# Altium footprint library ACTION_排针排座.PcbLib: 121 footprints (part 5 of 8)
Each footprint in its own frame and in the unit in brackets; x right, y up, seen from the top. Pads: shape width x height; smd on the part's side, far side on the other; paste and mask are expansions set on the pad; w line width, h text height; cw(c..) or ccw(c..) is an arc to the next point about the centre after c.
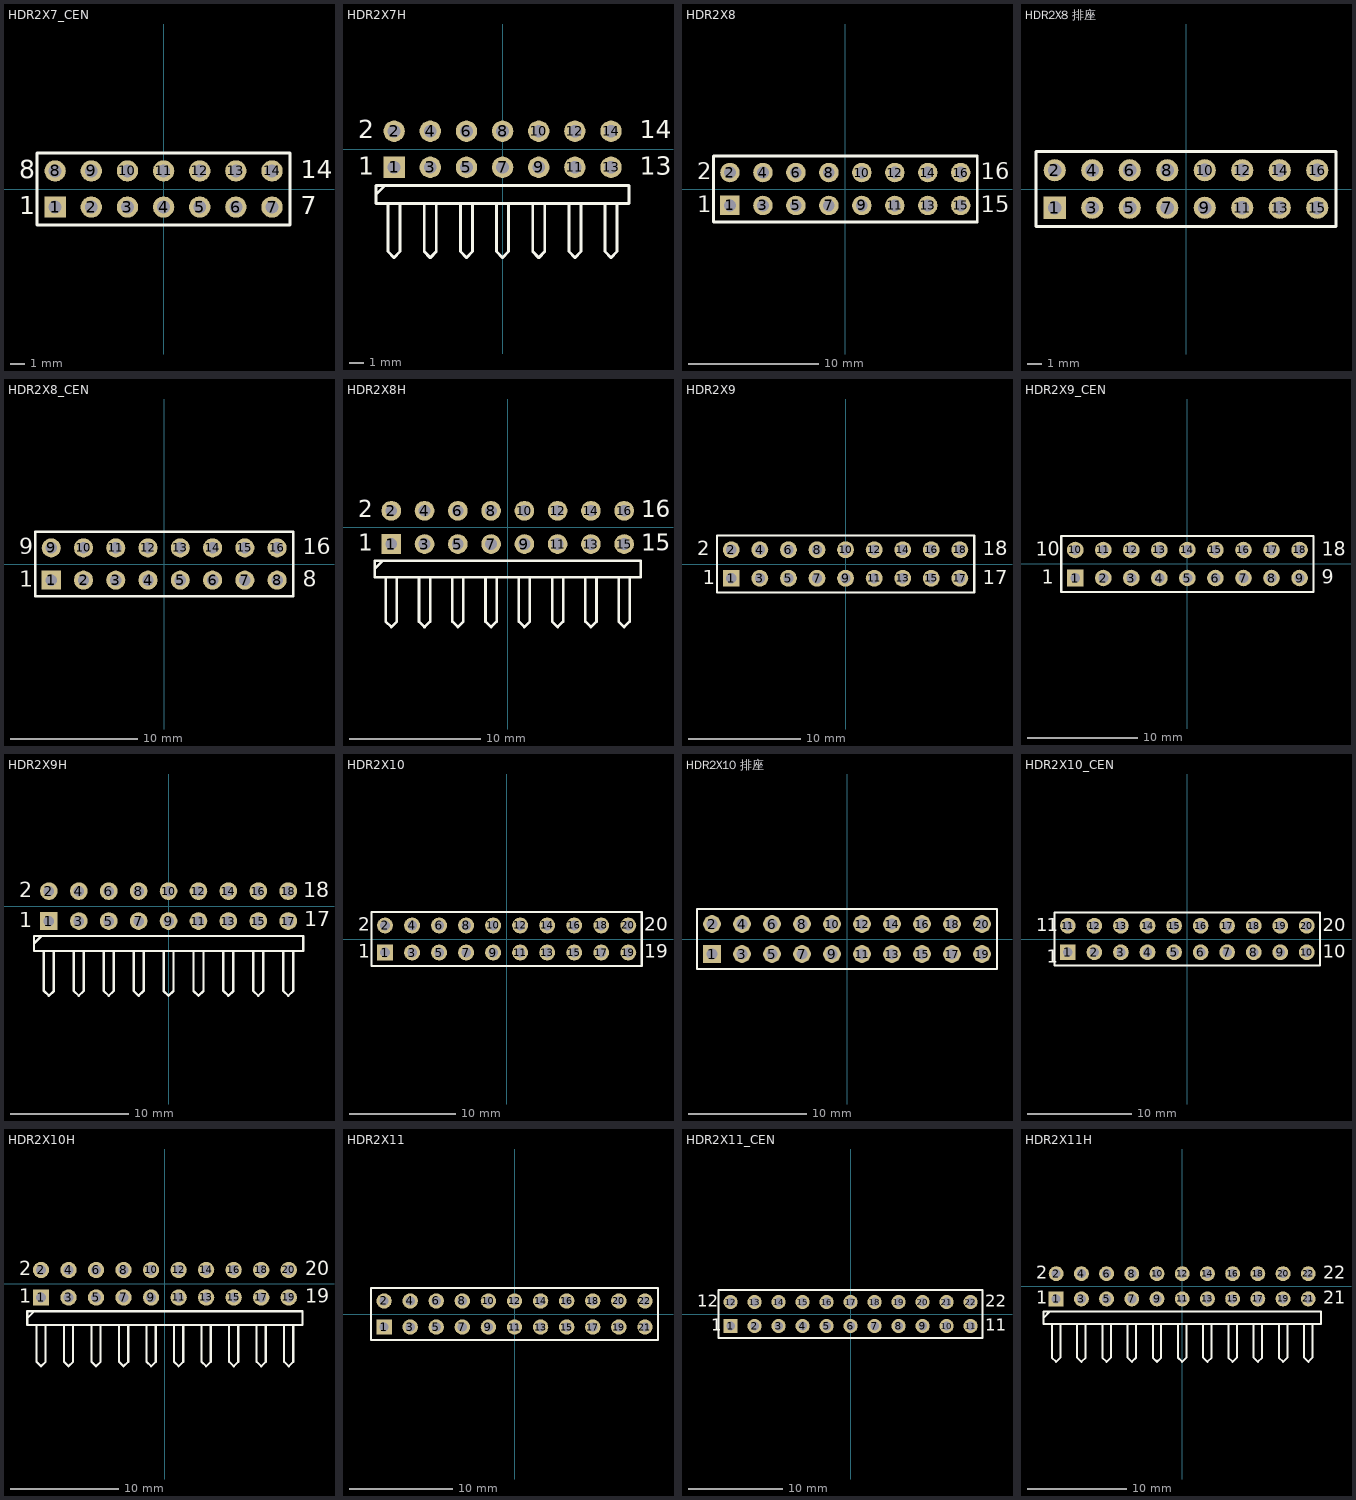
[diagram p4: the footprints below, top view; thin cyan lines are the x and y axes]

## HDR2X7_CEN [mm] "Connector; Header; 7x2 Position"
pads (14):
  rect 1.5x1.5 hole 0.9: 1(-7.62,-1.27)
  round 1.5 hole 0.9: 2(-5.08,-1.27) 3(-2.54,-1.27) 4(0,-1.27) 5(2.54,-1.27) 6(5.08,-1.27) 7(7.62,-1.27) 8(-7.62,1.27) 9(-5.08,1.27) 10(-2.54,1.27) 11(0,1.27) 12(2.54,1.27) 13(5.08,1.27) 14(7.62,1.27)
Top Overlay:
  lines w0.2: -8.89,-2.54 8.89,-2.54 8.89,2.54 -8.89,2.54 -8.89,-2.54
  text "8" at -10.16,0.762 h1.27
  text "1" at -10.16,-1.778 h1.27
  text "7" at 9.652,-1.778 h1.27
  text "14" at 9.652,0.762 h1.27
3D body "HEADER 7X2.STEP": height 10.1, standoff -1.5, extent -8.915,-2.54 8.865,2.54

## HDR2X7H [mm] "Connector; Header; 7x2 Position; Right Angle"
pads (14):
  rect 1.5x1.5 hole 0.9: 1(-7.62,-1.27)
  round 1.5 hole 0.9: 2(-7.62,1.27) 3(-5.08,-1.27) 4(-5.08,1.27) 5(-2.54,-1.27) 6(-2.54,1.27) 7(0,-1.27) 8(0,1.27) 9(2.54,-1.27) 10(2.54,1.27) 11(5.08,-1.27) 12(5.08,1.27) 13(7.62,-1.27) 14(7.62,1.27)
Top Overlay:
  lines w0.2: -8.89,-3.175 -8.255,-2.54 ; -8.043,-3.81 -8.043,-7.197 -7.62,-7.62 -7.197,-7.197 -7.197,-3.81 ; -5.503,-3.81 -5.503,-7.197 -5.08,-7.62 -4.657,-7.197 -4.657,-3.81 ; -2.963,-3.81 -2.963,-7.197 -2.54,-7.62 -2.117,-7.197 -2.117,-3.81 ; -0.423,-3.81 -0.423,-7.197 0,-7.62 0.423,-7.197 0.423,-3.81 ; 2.117,-3.81 2.117,-7.197 2.54,-7.62 2.963,-7.197 2.963,-3.81 ; 4.657,-3.81 4.657,-7.197 5.08,-7.62 5.503,-7.197 5.503,-3.81 ; 7.197,-3.81 7.197,-7.197 7.62,-7.62 8.043,-7.197 8.043,-3.81 ; -8.89,-3.81 -8.89,-2.54 8.89,-2.54 8.89,-3.81 -8.89,-3.81
  text "2" at -10.16,0.762 h1.27
  text "1" at -10.16,-1.778 h1.27
  text "13" at 9.652,-1.778 h1.27
  text "14" at 9.652,0.762 h1.27
3D body "65806.stp": height 3.74, standoff -4.34, extent -8.89,-11.309 8.89,1.591

## HDR2X8 [mm] "Connector; Header; 8x2 Position"
pads (16):
  rect 1.5x1.5 hole 0.9: 1(-8.89,-1.27)
  round 1.5 hole 0.9: 2(-8.89,1.27) 3(-6.35,-1.27) 4(-6.35,1.27) 5(-3.81,-1.27) 6(-3.81,1.27) 7(-1.27,-1.27) 8(-1.27,1.27) 9(1.27,-1.27) 10(1.27,1.27) 11(3.81,-1.27) 12(3.81,1.27) 13(6.35,-1.27) 14(6.35,1.27) 15(8.89,-1.27) 16(8.89,1.27)
Top Overlay:
  lines w0.2: -10.16,-2.54 -10.16,2.54 10.16,2.54 10.16,-2.54 -10.16,-2.54
  text "2" at -11.43,0.762 h1.27
  text "1" at -11.43,-1.778 h1.27
  text "15" at 10.414,-1.778 h1.27
  text "16" at 10.414,0.762 h1.27
3D body "HEADER 8X2.STEP": height 10.1, standoff -1.5, extent -10.109,-2.54 10.211,2.54

## HDR2X8 排座 [mm] "Connector; Header; 8x2 Position"
pads (16):
  rect 1.5x1.5 hole 0.9: 1(-8.89,-1.27)
  round 1.5 hole 0.9: 2(-8.89,1.27) 3(-6.35,-1.27) 4(-6.35,1.27) 5(-3.81,-1.27) 6(-3.81,1.27) 7(-1.27,-1.27) 8(-1.27,1.27) 9(1.27,-1.27) 10(1.27,1.27) 11(3.81,-1.27) 12(3.81,1.27) 13(6.35,-1.27) 14(6.35,1.27) 15(8.89,-1.27) 16(8.89,1.27)
Top Overlay:
  lines w0.2: -10.16,-2.54 10.16,-2.54 10.16,2.54 -10.16,2.54 -10.16,-2.54
3D body "pcb_connector_803-87-016-65-410101.stp": height 7, standoff -2.8, extent -10.16,-2.54 10.16,2.54

## HDR2X8_CEN [mm] "Connector; Header; 8x2 Position"
pads (16):
  rect 1.5x1.5 hole 0.9: 1(-8.89,-1.27)
  round 1.5 hole 0.9: 2(-6.35,-1.27) 3(-3.81,-1.27) 4(-1.27,-1.27) 5(1.27,-1.27) 6(3.81,-1.27) 7(6.35,-1.27) 8(8.89,-1.27) 9(-8.89,1.27) 10(-6.35,1.27) 11(-3.81,1.27) 12(-1.27,1.27) 13(1.27,1.27) 14(3.81,1.27) 15(6.35,1.27) 16(8.89,1.27)
Top Overlay:
  lines w0.2: -10.16,-2.54 -10.16,2.54 10.16,2.54 10.16,-2.54 -10.16,-2.54
  text "9" at -11.43,0.762 h1.27
  text "1" at -11.43,-1.778 h1.27
  text "8" at 10.922,-1.778 h1.27
  text "16" at 10.922,0.762 h1.27
3D body "HEADER 8X2.STEP": height 10.1, standoff -1.5, extent -10.135,-2.565 10.185,2.515

## HDR2X8H [mm] "Connector; Header; 8x2 Position; Right Angle"
pads (16):
  rect 1.5x1.5 hole 0.9: 1(-8.89,-1.27)
  round 1.5 hole 0.9: 2(-8.89,1.27) 3(-6.35,-1.27) 4(-6.35,1.27) 5(-3.81,-1.27) 6(-3.81,1.27) 7(-1.27,-1.27) 8(-1.27,1.27) 9(1.27,-1.27) 10(1.27,1.27) 11(3.81,-1.27) 12(3.81,1.27) 13(6.35,-1.27) 14(6.35,1.27) 15(8.89,-1.27) 16(8.89,1.27)
Top Overlay:
  lines w0.2: -10.16,-3.175 -9.525,-2.54 ; -9.313,-3.81 -9.313,-7.197 -8.89,-7.62 -8.467,-7.197 -8.467,-3.81 ; -6.773,-3.81 -6.773,-7.197 -6.35,-7.62 -5.927,-7.197 -5.927,-3.81 ; -4.233,-3.81 -4.233,-7.197 -3.81,-7.62 -3.387,-7.197 -3.387,-3.81 ; -1.693,-3.81 -1.693,-7.197 -1.27,-7.62 -0.847,-7.197 -0.847,-3.81 ; 0.847,-3.81 0.847,-7.197 1.27,-7.62 1.693,-7.197 1.693,-3.81 ; 3.387,-3.81 3.387,-7.197 3.81,-7.62 4.233,-7.197 4.233,-3.81 ; 5.927,-3.81 5.927,-7.197 6.35,-7.62 6.773,-7.197 6.773,-3.81 ; 8.467,-3.81 8.467,-7.197 8.89,-7.62 9.313,-7.197 9.313,-3.81 ; -10.16,-3.81 -10.16,-2.54 10.16,-2.54 10.16,-3.81 -10.16,-3.81
  text "2" at -11.43,0.762 h1.27
  text "1" at -11.43,-1.778 h1.27
  text "15" at 10.179,-1.778 h1.27
  text "16" at 10.202,0.762 h1.27
3D body "2×8弯.stp": height 5.8, standoff -2.97, extent -10.211,-11.729 10.109,1.626

## HDR2X9 [mm] "Connector; Header; 9x2 Position"
pads (18):
  rect 1.5x1.5 hole 0.9: 1(-10.16,-1.27)
  round 1.5 hole 0.9: 2(-10.16,1.27) 3(-7.62,-1.27) 4(-7.62,1.27) 5(-5.08,-1.27) 6(-5.08,1.27) 7(-2.54,-1.27) 8(-2.54,1.27) 9(0,-1.27) 10(0,1.27) 11(2.54,-1.27) 12(2.54,1.27) 13(5.08,-1.27) 14(5.08,1.27) 15(7.62,-1.27) 16(7.62,1.27) 17(10.16,-1.27) 18(10.16,1.27)
Top Overlay:
  lines w0.2: -11.43,-2.54 -11.43,2.54 11.43,2.54 11.43,-2.54 -11.43,-2.54
  text "2" at -13.208,0.762 h1.27
  text "1" at -12.7,-1.778 h1.27
  text "17" at 12.192,-1.778 h1.27
  text "18" at 12.192,0.762 h1.27
3D body "HEADER 9X2.STEP": height 10.1, standoff -1.5, extent -11.43,-2.54 11.43,2.54

## HDR2X9_CEN [mm] "Connector; Header; 9x2 Position"
pads (18):
  rect 1.5x1.5 hole 0.9: 1(-10.16,-1.27)
  round 1.5 hole 0.9: 2(-7.62,-1.27) 3(-5.08,-1.27) 4(-2.54,-1.27) 5(0,-1.27) 6(2.54,-1.27) 7(5.08,-1.27) 8(7.62,-1.27) 9(10.16,-1.27) 10(-10.16,1.27) 11(-7.62,1.27) 12(-5.08,1.27) 13(-2.54,1.27) 14(0,1.27) 15(2.54,1.27) 16(5.08,1.27) 17(7.62,1.27) 18(10.16,1.27)
Top Overlay:
  lines w0.2: -11.43,-2.54 -11.43,2.54 11.43,2.54 11.43,-2.54 -11.43,-2.54
  text "10" at -13.716,0.762 h1.27
  text "1" at -13.208,-1.778 h1.27
  text "9" at 12.192,-1.778 h1.27
  text "18" at 12.192,0.762 h1.27

## HDR2X9H [mm] "Connector; Header; 9x2 Position; Right Angle"
pads (18):
  rect 1.5x1.5 hole 0.9: 1(-10.16,-1.27)
  round 1.5 hole 0.9: 2(-10.16,1.27) 3(-7.62,-1.27) 4(-7.62,1.27) 5(-5.08,-1.27) 6(-5.08,1.27) 7(-2.54,-1.27) 8(-2.54,1.27) 9(0,-1.27) 10(0,1.27) 11(2.54,-1.27) 12(2.54,1.27) 13(5.08,-1.27) 14(5.08,1.27) 15(7.62,-1.27) 16(7.62,1.27) 17(10.16,-1.27) 18(10.16,1.27)
Top Overlay:
  lines w0.2: -11.43,-3.175 -10.795,-2.54 ; -10.583,-3.81 -10.583,-7.197 -10.16,-7.62 -9.737,-7.197 -9.737,-3.81 ; -8.043,-3.81 -8.043,-7.197 -7.62,-7.62 -7.197,-7.197 -7.197,-3.81 ; -5.503,-3.81 -5.503,-7.197 -5.08,-7.62 -4.657,-7.197 -4.657,-3.81 ; -2.963,-3.81 -2.963,-7.197 -2.54,-7.62 -2.117,-7.197 -2.117,-3.81 ; -0.423,-3.81 -0.423,-7.197 0,-7.62 0.423,-7.197 0.423,-3.81 ; 2.117,-3.81 2.117,-7.197 2.54,-7.62 2.963,-7.197 2.963,-3.81 ; 4.657,-3.81 4.657,-7.197 5.08,-7.62 5.503,-7.197 5.503,-3.81 ; 7.197,-3.81 7.197,-7.197 7.62,-7.62 8.043,-7.197 8.043,-3.81 ; 9.737,-3.81 9.737,-7.197 10.16,-7.62 10.583,-7.197 10.583,-3.81 ; -11.43,-3.81 11.43,-3.81 11.43,-2.54 -11.43,-2.54 -11.43,-3.81
  text "2" at -12.7,0.762 h1.27
  text "18" at 11.433,0.762 h1.27
  text "17" at 11.504,-1.71 h1.27
  text "1" at -12.7,-1.778 h1.27
3D body "826953-9.stp": height 5.8, standoff -2.97, extent -11.328,-11.805 11.532,1.55

## HDR2X10 [mm] "Connector; Header; 10x2 Position"
pads (20):
  rect 1.5x1.5 hole 0.9: 1(-11.43,-1.27)
  round 1.5 hole 0.9: 2(-11.43,1.27) 3(-8.89,-1.27) 4(-8.89,1.27) 5(-6.35,-1.27) 6(-6.35,1.27) 7(-3.81,-1.27) 8(-3.81,1.27) 9(-1.27,-1.27) 10(-1.27,1.27) 11(1.27,-1.27) 12(1.27,1.27) 13(3.81,-1.27) 14(3.81,1.27) 15(6.35,-1.27) 16(6.35,1.27) 17(8.89,-1.27) 18(8.89,1.27) 19(11.43,-1.27) 20(11.43,1.27)
Top Overlay:
  lines w0.2: -12.7,-2.54 -10.795,-2.54 12.7,-2.54 12.7,2.54 -10.795,2.54 -12.7,2.54 -12.7,-2.54
  text "20" at 12.954,0.762 h1.27
  text "19" at 12.954,-1.778 h1.27
  text "1" at -13.97,-1.778 h1.27
  text "2" at -13.97,0.762 h1.27
3D body "HEADER 10X2.STEP": height 10.1, standoff -1.5, extent -12.751,-2.54 12.649,2.54

## HDR2X10 排座 [mm] "Connector; Header; 10x2 Position"
pads (20):
  rect 1.5x1.5 hole 0.9: 1(-11.43,-1.27)
  round 1.5 hole 0.9: 2(-11.43,1.27) 3(-8.89,-1.27) 4(-8.89,1.27) 5(-6.35,-1.27) 6(-6.35,1.27) 7(-3.81,-1.27) 8(-3.81,1.27) 9(-1.27,-1.27) 10(-1.27,1.27) 11(1.27,-1.27) 12(1.27,1.27) 13(3.81,-1.27) 14(3.81,1.27) 15(6.35,-1.27) 16(6.35,1.27) 17(8.89,-1.27) 18(8.89,1.27) 19(11.43,-1.27) 20(11.43,1.27)
Top Overlay:
  lines w0.2: -12.7,-2.54 -12.7,2.54 -10.795,2.54 12.7,2.54 12.7,-2.54 -10.795,-2.54 -12.7,-2.54
3D body "pcb_connector_803-87-020-65-410101.stp": height 7, standoff -2.8, extent -12.7,-2.54 12.7,2.54

## HDR2X10_CEN [mm] "Connector; Header; 10x2 Position"
pads (20):
  rect 1.5x1.5 hole 0.9: 1(-11.43,-1.27)
  round 1.5 hole 0.9: 2(-8.89,-1.27) 3(-6.35,-1.27) 4(-3.81,-1.27) 5(-1.27,-1.27) 6(1.27,-1.27) 7(3.81,-1.27) 8(6.35,-1.27) 9(8.89,-1.27) 10(11.43,-1.27) 11(-11.43,1.27) 12(-8.89,1.27) 13(-6.35,1.27) 14(-3.81,1.27) 15(-1.27,1.27) 16(1.27,1.27) 17(3.81,1.27) 18(6.35,1.27) 19(8.89,1.27) 20(11.43,1.27)
Top Overlay:
  lines w0.2: -12.7,-2.54 12.7,-2.54 12.7,2.54 -12.7,2.54 -12.7,-2.54
  text "1" at -13.462,-2.286 h1.27
  text "1" at -14.478,0.762 h1.27
  text "1" at -13.462,0.762 h1.27
  text "10" at 12.954,-1.778 h1.27
  text "20" at 12.954,0.762 h1.27
3D body "HEADER 10X2.STEP": height 10.1, standoff -1.5, extent -12.675,-2.515 12.725,2.565

## HDR2X10H [mm] "Connector; Header; 10x2 Position; Right Angle"
pads (20):
  rect 1.5x1.5 hole 0.9: 1(-11.43,-1.27)
  round 1.5 hole 0.9: 2(-11.43,1.27) 3(-8.89,-1.27) 4(-8.89,1.27) 5(-6.35,-1.27) 6(-6.35,1.27) 7(-3.81,-1.27) 8(-3.81,1.27) 9(-1.27,-1.27) 10(-1.27,1.27) 11(1.27,-1.27) 12(1.27,1.27) 13(3.81,-1.27) 14(3.81,1.27) 15(6.35,-1.27) 16(6.35,1.27) 17(8.89,-1.27) 18(8.89,1.27) 19(11.43,-1.27) 20(11.43,1.27)
Top Overlay:
  lines w0.2: -12.7,-3.175 -12.065,-2.54 ; -11.853,-3.81 -11.853,-7.197 -11.43,-7.62 -11.007,-7.197 -11.007,-3.81 ; -9.313,-3.81 -9.313,-7.197 -8.89,-7.62 -8.467,-7.197 -8.467,-3.81 ; -6.773,-3.81 -6.773,-7.197 -6.35,-7.62 -5.927,-7.197 -5.927,-3.81 ; -4.233,-3.81 -4.233,-7.197 -3.81,-7.62 -3.387,-7.197 -3.387,-3.81 ; -1.693,-3.81 -1.693,-7.197 -1.27,-7.62 -0.847,-7.197 -0.847,-3.81 ; 0.847,-3.81 0.847,-7.197 1.27,-7.62 1.693,-7.197 1.693,-3.81 ; 3.387,-3.81 3.387,-7.197 3.81,-7.62 4.233,-7.197 4.233,-3.81 ; 5.927,-3.81 5.927,-7.197 6.35,-7.62 6.773,-7.197 6.773,-3.81 ; 8.467,-3.81 8.467,-7.197 8.89,-7.62 9.313,-7.197 9.313,-3.81 ; 11.007,-3.81 11.007,-7.197 11.43,-7.62 11.853,-7.197 11.853,-3.81 ; -12.7,-3.81 12.7,-3.81 12.7,-2.54 -12.7,-2.54 -12.7,-3.81
  text "20" at 12.954,0.762 h1.27
  text "19" at 12.954,-1.778 h1.27
  text "2" at -13.462,0.762 h1.27
  text "1" at -13.462,-1.778 h1.27
3D body "2×10弯.stp": height 5.8, standoff -2.97, extent -12.7,-11.707 12.7,1.648

## HDR2X11 [mm] "Connector; Header; 11x2 Position"
pads (22):
  rect 1.5x1.5 hole 0.9: 1(-12.7,-1.27)
  round 1.5 hole 0.9: 2(-12.7,1.27) 3(-10.16,-1.27) 4(-10.16,1.27) 5(-7.62,-1.27) 6(-7.62,1.27) 7(-5.08,-1.27) 8(-5.08,1.27) 9(-2.54,-1.27) 10(-2.54,1.27) 11(0,-1.27) 12(0,1.27) 13(2.54,-1.27) 14(2.54,1.27) 15(5.08,-1.27) 16(5.08,1.27) 17(7.62,-1.27) 18(7.62,1.27) 19(10.16,-1.27) 20(10.16,1.27) 21(12.7,-1.27) 22(12.7,1.27)
Top Overlay:
  lines w0.2: -13.97,-2.54 -13.97,2.54 13.97,2.54 13.97,-2.54 -13.97,-2.54
3D body "HEADER 11X2.STEP": height 10.1, standoff -1.5, extent -13.97,-2.54 13.97,2.54

## HDR2X11_CEN [mm] "Connector; Header; 11x2 Position"
pads (22):
  rect 1.5x1.5 hole 0.9: 1(-12.7,-1.27)
  round 1.5 hole 0.9: 2(-10.16,-1.27) 3(-7.62,-1.27) 4(-5.08,-1.27) 5(-2.54,-1.27) 6(0,-1.27) 7(2.54,-1.27) 8(5.08,-1.27) 9(7.62,-1.27) 10(10.16,-1.27) 11(12.7,-1.27) 12(-12.7,1.27) 13(-10.16,1.27) 14(-7.62,1.27) 15(-5.08,1.27) 16(-2.54,1.27) 17(0,1.27) 18(2.54,1.27) 19(5.08,1.27) 20(7.62,1.27) 21(10.16,1.27) 22(12.7,1.27)
Top Overlay:
  lines w0.2: -13.97,-2.54 13.97,-2.54 13.97,2.54 -13.97,2.54 -13.97,-2.54
  text "22" at 14.224,0.762 h1.27
  text "11" at 14.224,-1.778 h1.27
  text "12" at -16.256,0.762 h1.27
  text "1" at -14.732,-1.778 h1.27
3D body "HEADER 11X2.STEP": height 10.1, standoff -1.5, extent -13.995,-2.54 13.945,2.54

## HDR2X11H [mm] "Connector; Header; 11x2 Position; Right Angle"
pads (22):
  rect 1.5x1.5 hole 0.9: 1(-12.7,-1.27)
  round 1.5 hole 0.9: 2(-12.7,1.27) 3(-10.16,-1.27) 4(-10.16,1.27) 5(-7.62,-1.27) 6(-7.62,1.27) 7(-5.08,-1.27) 8(-5.08,1.27) 9(-2.54,-1.27) 10(-2.54,1.27) 11(0,-1.27) 12(0,1.27) 13(2.54,-1.27) 14(2.54,1.27) 15(5.08,-1.27) 16(5.08,1.27) 17(7.62,-1.27) 18(7.62,1.27) 19(10.16,-1.27) 20(10.16,1.27) 21(12.7,-1.27) 22(12.7,1.27)
Top Overlay:
  lines w0.2: -13.97,-3.175 -13.335,-2.54 ; -13.123,-3.81 -13.123,-7.197 -12.7,-7.62 -12.277,-7.197 -12.277,-3.81 ; -10.583,-3.81 -10.583,-7.197 -10.16,-7.62 -9.737,-7.197 -9.737,-3.81 ; -8.043,-3.81 -8.043,-7.197 -7.62,-7.62 -7.197,-7.197 -7.197,-3.81 ; -5.503,-3.81 -5.503,-7.197 -5.08,-7.62 -4.657,-7.197 -4.657,-3.81 ; -2.963,-3.81 -2.963,-7.197 -2.54,-7.62 -2.117,-7.197 -2.117,-3.81 ; -0.423,-3.81 -0.423,-7.197 0,-7.62 0.423,-7.197 0.423,-3.81 ; 2.117,-3.81 2.117,-7.197 2.54,-7.62 2.963,-7.197 2.963,-3.81 ; 4.657,-3.81 4.657,-7.197 5.08,-7.62 5.503,-7.197 5.503,-3.81 ; 7.197,-3.81 7.197,-7.197 7.62,-7.62 8.043,-7.197 8.043,-3.81 ; 9.737,-3.81 9.737,-7.197 10.16,-7.62 10.583,-7.197 10.583,-3.81 ; 12.277,-3.81 12.277,-7.197 12.7,-7.62 13.123,-7.197 13.123,-3.81 ; -13.97,-3.81 13.97,-3.81 13.97,-2.54 -13.97,-2.54 -13.97,-3.81
  text "2" at -14.732,0.762 h1.27
  text "1" at -14.732,-1.778 h1.27
  text "21" at 14.224,-1.778 h1.27
  text "22" at 14.224,0.762 h1.27
3D body "65820.stp": height 5.21, standoff -2.87, extent -13.995,-11.151 13.945,1.749